# Altium schematic symbol library jlcpcb_2025_04_resistors_extended_2512.schlib: 2667 symbols (part 6 of 14) (continued)
## CRGP2512F100K
designator R?  Resistance: 100kΩ  (hidden comment: *)
Resistor, 100kΩ, ±1%, 2W, 500V, ±100ppm/℃, -55℃~+155℃, SMD 2512; Manufacturer: Uniroyal; Manufacturer Part Number: CRGP2512F100K; Supplier 1: LCSC; Supplier Part Number 1: C2073427; JLCPCB Part Number: C2073427; Power Rating: 2W; Category: Resistors; Package Size: 2512; JLCPCB Basic Part: Yes; Tolerance: ±1%; Voltage Rating: 500V; Temperature Coefficient: ±100ppm/℃; Temperature Rating: -55℃~+155℃; ComponentLink1Description: Datasheet; ComponentLink1URL: https://wmsc.lcsc.com/wmsc/upload/file/pdf/v2/lcsc/2304140030_TE-Connectivity-CRGP2512F100K_C2073427.pdf; ComponentLink2Description: JLCPCB Part URL; ComponentLink2URL: https://jlcpcb.com/partdetail/C2073427
pins: 1, 2
1 alternate drawing of the same symbol

## CRGP2512F220R
designator R?  Resistance: 220Ω  (hidden comment: *)
Resistor, 220Ω, ±1%, 2W, 500V, ±100ppm/℃, -55℃~+155℃, SMD 2512; Manufacturer: Uniroyal; Manufacturer Part Number: CRGP2512F220R; Supplier 1: LCSC; Supplier Part Number 1: C2075299; JLCPCB Part Number: C2075299; Power Rating: 2W; Category: Resistors; Package Size: 2512; JLCPCB Basic Part: Yes; Tolerance: ±1%; Voltage Rating: 500V; Temperature Coefficient: ±100ppm/℃; Temperature Rating: -55℃~+155℃; ComponentLink1Description: Datasheet; ComponentLink1URL: https://wmsc.lcsc.com/wmsc/upload/file/pdf/v2/lcsc/2304140030_TE-Connectivity-CRGP2512F220R_C2075299.pdf; ComponentLink2Description: JLCPCB Part URL; ComponentLink2URL: https://jlcpcb.com/partdetail/C2075299
pins: 1, 2
1 alternate drawing of the same symbol

## CRGP2512F820R
designator R?  Resistance: 820Ω  (hidden comment: *)
Resistor, 820Ω, ±1%, 2W, ±100ppm/℃, -55℃~+155℃, SMD 2512; Manufacturer: Uniroyal; Manufacturer Part Number: CRGP2512F820R; Supplier 1: LCSC; Supplier Part Number 1: C4287698; JLCPCB Part Number: C4287698; Power Rating: 2W; Category: Resistors; Package Size: 2512; JLCPCB Basic Part: Yes; Tolerance: ±1%; Temperature Coefficient: ±100ppm/℃; Temperature Rating: -55℃~+155℃; ComponentLink1Description: Datasheet; ComponentLink1URL: https://wmsc.lcsc.com/wmsc/upload/file/pdf/v2/lcsc/2403201310_TE-Connectivity-CRGP2512F820R_C4287698.pdf; ComponentLink2Description: JLCPCB Part URL; ComponentLink2URL: https://jlcpcb.com/partdetail/C4287698
pins: 1, 2
1 alternate drawing of the same symbol

## CRH2512F1K20E04Z
designator R?  Resistance: 1.2kΩ  (hidden comment: *)
Resistor, 1.2kΩ, ±1%, 2W, 200V, ±100ppm/℃, -55℃~+155℃, SMD 2512; Manufacturer: Uniroyal; Manufacturer Part Number: CRH2512F1K20E04Z; Supplier 1: LCSC; Supplier Part Number 1: C175323; JLCPCB Part Number: C175323; Power Rating: 2W; Category: Resistors; Package Size: 2512; JLCPCB Basic Part: Yes; Tolerance: ±1%; Voltage Rating: 200V; Temperature Coefficient: ±100ppm/℃; Temperature Rating: -55℃~+155℃; ComponentLink1Description: Datasheet; ComponentLink1URL: https://wmsc.lcsc.com/wmsc/upload/file/pdf/v2/lcsc/2304140030_Ever-Ohms-Tech-CRH2512F1K20E04Z_C175323.pdf; ComponentLink2Description: JLCPCB Part URL; ComponentLink2URL: https://jlcpcb.com/partdetail/C175323
pins: 1, 2
1 alternate drawing of the same symbol

## CRH2512F1K50E04Z
designator R?  Resistance: 1.5kΩ  (hidden comment: *)
Resistor, 1.5kΩ, ±1%, 2W, 200V, ±100ppm/℃, -55℃~+155℃, SMD 2512; Manufacturer: Uniroyal; Manufacturer Part Number: CRH2512F1K50E04Z; Supplier 1: LCSC; Supplier Part Number 1: C175325; JLCPCB Part Number: C175325; Power Rating: 2W; Category: Resistors; Package Size: 2512; JLCPCB Basic Part: Yes; Tolerance: ±1%; Voltage Rating: 200V; Temperature Coefficient: ±100ppm/℃; Temperature Rating: -55℃~+155℃; ComponentLink1Description: Datasheet; ComponentLink1URL: https://wmsc.lcsc.com/wmsc/upload/file/pdf/v2/lcsc/2304140030_Ever-Ohms-Tech-CRH2512F1K50E04Z_C175325.pdf; ComponentLink2Description: JLCPCB Part URL; ComponentLink2URL: https://jlcpcb.com/partdetail/C175325
pins: 1, 2
1 alternate drawing of the same symbol

## CRH2512F1R00E04S
designator R?  Resistance: 1Ω  (hidden comment: *)
Resistor, 1Ω, ±1%, 2W, 200V, ±400ppm/℃, -55℃~+155℃, SMD 2512; Manufacturer: Uniroyal; Manufacturer Part Number: CRH2512F1R00E04S; Supplier 1: LCSC; Supplier Part Number 1: C2832126; JLCPCB Part Number: C2832126; Power Rating: 2W; Category: Resistors; Package Size: 2512; JLCPCB Basic Part: Yes; Tolerance: ±1%; Voltage Rating: 200V; Temperature Coefficient: ±400ppm/℃; Temperature Rating: -55℃~+155℃; ComponentLink1Description: Datasheet; ComponentLink1URL: https://wmsc.lcsc.com/wmsc/upload/file/pdf/v2/lcsc/2105241455_Ever-Ohms-Tech-CRH2512F1R00E04S_C2832126.pdf; ComponentLink2Description: JLCPCB Part URL; ComponentLink2URL: https://jlcpcb.com/partdetail/C2832126
pins: 1, 2
1 alternate drawing of the same symbol

## CRH2512F1R20E04S
designator R?  Resistance: 1.2Ω  (hidden comment: *)
Resistor, 1.2Ω, ±1%, 2W, 200V, ±400ppm/℃, -55℃~+155℃, SMD 2512; Manufacturer: Uniroyal; Manufacturer Part Number: CRH2512F1R20E04S; Supplier 1: LCSC; Supplier Part Number 1: C2897628; JLCPCB Part Number: C2897628; Power Rating: 2W; Category: Resistors; Package Size: 2512; JLCPCB Basic Part: Yes; Tolerance: ±1%; Voltage Rating: 200V; Temperature Coefficient: ±400ppm/℃; Temperature Rating: -55℃~+155℃; ComponentLink1Description: Datasheet; ComponentLink1URL: https://wmsc.lcsc.com/wmsc/upload/file/pdf/v2/lcsc/2109152030_Ever-Ohms-Tech-CRH2512F1R20E04S_C2897628.pdf; ComponentLink2Description: JLCPCB Part URL; ComponentLink2URL: https://jlcpcb.com/partdetail/C2897628
pins: 1, 2
1 alternate drawing of the same symbol

## CRH2512F1R20E04Z
designator R?  Resistance: 1.2Ω  (hidden comment: *)
Resistor, 1.2Ω, ±1%, 2W, 200V, ±400ppm/℃, -55℃~+155℃, SMD 2512; Manufacturer: Uniroyal; Manufacturer Part Number: CRH2512F1R20E04Z; Supplier 1: LCSC; Supplier Part Number 1: C149854; JLCPCB Part Number: C149854; Power Rating: 2W; Category: Resistors; Package Size: 2512; JLCPCB Basic Part: Yes; Tolerance: ±1%; Voltage Rating: 200V; Temperature Coefficient: ±400ppm/℃; Temperature Rating: -55℃~+155℃; ComponentLink1Description: Datasheet; ComponentLink1URL: https://wmsc.lcsc.com/wmsc/upload/file/pdf/v2/lcsc/2304140030_Ever-Ohms-Tech-CRH2512F1R20E04Z_C149854.pdf; ComponentLink2Description: JLCPCB Part URL; ComponentLink2URL: https://jlcpcb.com/partdetail/C149854
pins: 1, 2
1 alternate drawing of the same symbol

## CRH2512F1R50E04S
designator R?  Resistance: 1.5Ω  (hidden comment: *)
Resistor, 1.5Ω, ±1%, 2W, 200V, ±400ppm/℃, -55℃~+155℃, SMD 2512; Manufacturer: Uniroyal; Manufacturer Part Number: CRH2512F1R50E04S; Supplier 1: LCSC; Supplier Part Number 1: C2928913; JLCPCB Part Number: C2928913; Power Rating: 2W; Category: Resistors; Package Size: 2512; JLCPCB Basic Part: Yes; Tolerance: ±1%; Voltage Rating: 200V; Temperature Coefficient: ±400ppm/℃; Temperature Rating: -55℃~+155℃; ComponentLink1Description: Datasheet; ComponentLink1URL: https://wmsc.lcsc.com/wmsc/upload/file/pdf/v2/lcsc/2201121400_Ever-Ohms-Tech-CRH2512F1R50E04S_C2928913.pdf; ComponentLink2Description: JLCPCB Part URL; ComponentLink2URL: https://jlcpcb.com/partdetail/C2928913
pins: 1, 2
1 alternate drawing of the same symbol

## CRH2512F1R80E04Z
designator R?  Resistance: 1.8Ω  (hidden comment: *)
Resistor, 1.8Ω, ±1%, 2W, 200V, ±400ppm/℃, -55℃~+155℃, SMD 2512; Manufacturer: Uniroyal; Manufacturer Part Number: CRH2512F1R80E04Z; Supplier 1: LCSC; Supplier Part Number 1: C175221; JLCPCB Part Number: C175221; Power Rating: 2W; Category: Resistors; Package Size: 2512; JLCPCB Basic Part: Yes; Tolerance: ±1%; Voltage Rating: 200V; Temperature Coefficient: ±400ppm/℃; Temperature Rating: -55℃~+155℃; ComponentLink1Description: Datasheet; ComponentLink1URL: https://wmsc.lcsc.com/wmsc/upload/file/pdf/v2/lcsc/2304140030_Ever-Ohms-Tech-CRH2512F1R80E04Z_C175221.pdf; ComponentLink2Description: JLCPCB Part URL; ComponentLink2URL: https://jlcpcb.com/partdetail/C175221
pins: 1, 2
1 alternate drawing of the same symbol

## CRH2512F2R20E04Z
designator R?  Resistance: 2.2Ω  (hidden comment: *)
Resistor, 2.2Ω, ±1%, 2W, 200V, ±400ppm/℃, -55℃~+155℃, SMD 2512; Manufacturer: Uniroyal; Manufacturer Part Number: CRH2512F2R20E04Z; Supplier 1: LCSC; Supplier Part Number 1: C175223; JLCPCB Part Number: C175223; Power Rating: 2W; Category: Resistors; Package Size: 2512; JLCPCB Basic Part: Yes; Tolerance: ±1%; Voltage Rating: 200V; Temperature Coefficient: ±400ppm/℃; Temperature Rating: -55℃~+155℃; ComponentLink1Description: Datasheet; ComponentLink1URL: https://wmsc.lcsc.com/wmsc/upload/file/pdf/v2/lcsc/2304140030_Ever-Ohms-Tech-CRH2512F2R20E04Z_C175223.pdf; ComponentLink2Description: JLCPCB Part URL; ComponentLink2URL: https://jlcpcb.com/partdetail/C175223
pins: 1, 2
1 alternate drawing of the same symbol

## CRH2512F3K00E04Z
designator R?  Resistance: 3kΩ  (hidden comment: *)
Resistor, 3kΩ, ±1%, 2W, 200V, ±100ppm/℃, -55℃~+155℃, SMD 2512; Manufacturer: Uniroyal; Manufacturer Part Number: CRH2512F3K00E04Z; Supplier 1: LCSC; Supplier Part Number 1: C175333; JLCPCB Part Number: C175333; Power Rating: 2W; Category: Resistors; Package Size: 2512; JLCPCB Basic Part: Yes; Tolerance: ±1%; Voltage Rating: 200V; Temperature Coefficient: ±100ppm/℃; Temperature Rating: -55℃~+155℃; ComponentLink1Description: Datasheet; ComponentLink1URL: https://wmsc.lcsc.com/wmsc/upload/file/pdf/v2/lcsc/2310271456_Ever-Ohms-Tech-CRH2512F3K00E04Z_C175333.pdf; ComponentLink2Description: JLCPCB Part URL; ComponentLink2URL: https://jlcpcb.com/partdetail/C175333
pins: 1, 2
1 alternate drawing of the same symbol

## CRH2512F3R90E04Z
designator R?  Resistance: 3.9Ω  (hidden comment: *)
Resistor, 3.9Ω, ±1%, 2W, 200V, ±400ppm/℃, -55℃~+155℃, SMD 2512; Manufacturer: Uniroyal; Manufacturer Part Number: CRH2512F3R90E04Z; Supplier 1: LCSC; Supplier Part Number 1: C175232; JLCPCB Part Number: C175232; Power Rating: 2W; Category: Resistors; Package Size: 2512; JLCPCB Basic Part: Yes; Tolerance: ±1%; Voltage Rating: 200V; Temperature Coefficient: ±400ppm/℃; Temperature Rating: -55℃~+155℃; ComponentLink1Description: Datasheet; ComponentLink1URL: https://wmsc.lcsc.com/wmsc/upload/file/pdf/v2/lcsc/2304140030_Ever-Ohms-Tech-CRH2512F3R90E04Z_C175232.pdf; ComponentLink2Description: JLCPCB Part URL; ComponentLink2URL: https://jlcpcb.com/partdetail/C175232
pins: 1, 2
1 alternate drawing of the same symbol

## CRH2512F4R70E04S
designator R?  Resistance: 4.7Ω  (hidden comment: *)
Resistor, 4.7Ω, ±1%, 2W, 200V, ±400ppm/℃, -55℃~+155℃, SMD 2512; Manufacturer: Uniroyal; Manufacturer Part Number: CRH2512F4R70E04S; Supplier 1: LCSC; Supplier Part Number 1: C2897629; JLCPCB Part Number: C2897629; Power Rating: 2W; Category: Resistors; Package Size: 2512; JLCPCB Basic Part: Yes; Tolerance: ±1%; Voltage Rating: 200V; Temperature Coefficient: ±400ppm/℃; Temperature Rating: -55℃~+155℃; ComponentLink1Description: Datasheet; ComponentLink1URL: https://wmsc.lcsc.com/wmsc/upload/file/pdf/v2/lcsc/2109152030_Ever-Ohms-Tech-CRH2512F4R70E04S_C2897629.pdf; ComponentLink2Description: JLCPCB Part URL; ComponentLink2URL: https://jlcpcb.com/partdetail/C2897629
pins: 1, 2
1 alternate drawing of the same symbol

## CRH2512F5K10E04Z
designator R?  Resistance: 5.1kΩ  (hidden comment: *)
Resistor, 5.1kΩ, ±1%, 2W, 200V, ±100ppm/℃, -55℃~+155℃, SMD 2512; Manufacturer: Uniroyal; Manufacturer Part Number: CRH2512F5K10E04Z; Supplier 1: LCSC; Supplier Part Number 1: C175339; JLCPCB Part Number: C175339; Power Rating: 2W; Category: Resistors; Package Size: 2512; JLCPCB Basic Part: Yes; Tolerance: ±1%; Voltage Rating: 200V; Temperature Coefficient: ±100ppm/℃; Temperature Rating: -55℃~+155℃; ComponentLink1Description: Datasheet; ComponentLink1URL: https://wmsc.lcsc.com/wmsc/upload/file/pdf/v2/lcsc/2304140030_Ever-Ohms-Tech-CRH2512F5K10E04Z_C175339.pdf; ComponentLink2Description: JLCPCB Part URL; ComponentLink2URL: https://jlcpcb.com/partdetail/C175339
pins: 1, 2
1 alternate drawing of the same symbol

## CRH2512F5R10E04Z
designator R?  Resistance: 5.1Ω  (hidden comment: *)
Resistor, 5.1Ω, ±1%, 2W, 200V, ±400ppm/℃, -55℃~+155℃, SMD 2512; Manufacturer: Uniroyal; Manufacturer Part Number: CRH2512F5R10E04Z; Supplier 1: LCSC; Supplier Part Number 1: C175234; JLCPCB Part Number: C175234; Power Rating: 2W; Category: Resistors; Package Size: 2512; JLCPCB Basic Part: Yes; Tolerance: ±1%; Voltage Rating: 200V; Temperature Coefficient: ±400ppm/℃; Temperature Rating: -55℃~+155℃; ComponentLink1Description: Datasheet; ComponentLink1URL: https://wmsc.lcsc.com/wmsc/upload/file/pdf/v2/lcsc/2304140030_Ever-Ohms-Tech-CRH2512F5R10E04Z_C175234.pdf; ComponentLink2Description: JLCPCB Part URL; ComponentLink2URL: https://jlcpcb.com/partdetail/C175234
pins: 1, 2
1 alternate drawing of the same symbol

## CRH2512F6R80E04Z
designator R?  Resistance: 6.8Ω  (hidden comment: *)
Resistor, 6.8Ω, ±1%, 2W, 200V, ±400ppm/℃, -55℃~+155℃, SMD 2512; Manufacturer: Uniroyal; Manufacturer Part Number: CRH2512F6R80E04Z; Supplier 1: LCSC; Supplier Part Number 1: C175235; JLCPCB Part Number: C175235; Power Rating: 2W; Category: Resistors; Package Size: 2512; JLCPCB Basic Part: Yes; Tolerance: ±1%; Voltage Rating: 200V; Temperature Coefficient: ±400ppm/℃; Temperature Rating: -55℃~+155℃; ComponentLink1Description: Datasheet; ComponentLink1URL: https://wmsc.lcsc.com/wmsc/upload/file/pdf/v2/lcsc/2304140030_Ever-Ohms-Tech-CRH2512F6R80E04Z_C175235.pdf; ComponentLink2Description: JLCPCB Part URL; ComponentLink2URL: https://jlcpcb.com/partdetail/C175235
pins: 1, 2
1 alternate drawing of the same symbol

## CRH2512F10K0E04Z
designator R?  Resistance: 10kΩ  (hidden comment: *)
Resistor, 10kΩ, ±1%, 2W, 200V, ±100ppm/℃, -55℃~+155℃, SMD 2512; Manufacturer: Uniroyal; Manufacturer Part Number: CRH2512F10K0E04Z; Supplier 1: LCSC; Supplier Part Number 1: C175347; JLCPCB Part Number: C175347; Power Rating: 2W; Category: Resistors; Package Size: 2512; JLCPCB Basic Part: Yes; Tolerance: ±1%; Voltage Rating: 200V; Temperature Coefficient: ±100ppm/℃; Temperature Rating: -55℃~+155℃; ComponentLink1Description: Datasheet; ComponentLink1URL: https://wmsc.lcsc.com/wmsc/upload/file/pdf/v2/lcsc/2304140030_Ever-Ohms-Tech-CRH2512F10K0E04Z_C175347.pdf; ComponentLink2Description: JLCPCB Part URL; ComponentLink2URL: https://jlcpcb.com/partdetail/C175347
pins: 1, 2
1 alternate drawing of the same symbol

## CRH2512F12R0E04Z
designator R?  Resistance: 12Ω  (hidden comment: *)
Resistor, 12Ω, ±1%, 2W, 200V, ±100ppm/℃, -55℃~+155℃, SMD 2512; Manufacturer: Uniroyal; Manufacturer Part Number: CRH2512F12R0E04Z; Supplier 1: LCSC; Supplier Part Number 1: C175241; JLCPCB Part Number: C175241; Power Rating: 2W; Category: Resistors; Package Size: 2512; JLCPCB Basic Part: Yes; Tolerance: ±1%; Voltage Rating: 200V; Temperature Coefficient: ±100ppm/℃; Temperature Rating: -55℃~+155℃; ComponentLink1Description: Datasheet; ComponentLink1URL: https://wmsc.lcsc.com/wmsc/upload/file/pdf/v2/lcsc/2304140030_Ever-Ohms-Tech-CRH2512F12R0E04Z_C175241.pdf; ComponentLink2Description: JLCPCB Part URL; ComponentLink2URL: https://jlcpcb.com/partdetail/C175241
pins: 1, 2
1 alternate drawing of the same symbol

## CRH2512F15K0E04Z
designator R?  Resistance: 15kΩ  (hidden comment: *)
Resistor, 15kΩ, ±1%, 2W, 200V, ±100ppm/℃, -55℃~+155℃, SMD 2512; Manufacturer: Uniroyal; Manufacturer Part Number: CRH2512F15K0E04Z; Supplier 1: LCSC; Supplier Part Number 1: C175349; JLCPCB Part Number: C175349; Power Rating: 2W; Category: Resistors; Package Size: 2512; JLCPCB Basic Part: Yes; Tolerance: ±1%; Voltage Rating: 200V; Temperature Coefficient: ±100ppm/℃; Temperature Rating: -55℃~+155℃; ComponentLink1Description: Datasheet; ComponentLink1URL: https://wmsc.lcsc.com/wmsc/upload/file/pdf/v2/lcsc/2304140030_Ever-Ohms-Tech-CRH2512F15K0E04Z_C175349.pdf; ComponentLink2Description: JLCPCB Part URL; ComponentLink2URL: https://jlcpcb.com/partdetail/C175349
pins: 1, 2
1 alternate drawing of the same symbol

## CRH2512F16R0E04Z
designator R?  Resistance: 16Ω  (hidden comment: *)
Resistor, 16Ω, ±1%, 2W, 200V, ±100ppm/℃, -55℃~+155℃, SMD 2512; Manufacturer: Uniroyal; Manufacturer Part Number: CRH2512F16R0E04Z; Supplier 1: LCSC; Supplier Part Number 1: C175246; JLCPCB Part Number: C175246; Power Rating: 2W; Category: Resistors; Package Size: 2512; JLCPCB Basic Part: Yes; Tolerance: ±1%; Voltage Rating: 200V; Temperature Coefficient: ±100ppm/℃; Temperature Rating: -55℃~+155℃; ComponentLink1Description: Datasheet; ComponentLink1URL: https://wmsc.lcsc.com/wmsc/upload/file/pdf/v2/lcsc/2304140030_Ever-Ohms-Tech-CRH2512F16R0E04Z_C175246.pdf; ComponentLink2Description: JLCPCB Part URL; ComponentLink2URL: https://jlcpcb.com/partdetail/C175246
pins: 1, 2
1 alternate drawing of the same symbol

## CRH2512F18R0E04Z
designator R?  Resistance: 18Ω  (hidden comment: *)
Resistor, 18Ω, ±1%, 2W, 200V, ±100ppm/℃, -55℃~+155℃, SMD 2512; Manufacturer: Uniroyal; Manufacturer Part Number: CRH2512F18R0E04Z; Supplier 1: LCSC; Supplier Part Number 1: C175248; JLCPCB Part Number: C175248; Power Rating: 2W; Category: Resistors; Package Size: 2512; JLCPCB Basic Part: Yes; Tolerance: ±1%; Voltage Rating: 200V; Temperature Coefficient: ±100ppm/℃; Temperature Rating: -55℃~+155℃; ComponentLink1Description: Datasheet; ComponentLink1URL: https://wmsc.lcsc.com/wmsc/upload/file/pdf/v2/lcsc/2304140030_Ever-Ohms-Tech-CRH2512F18R0E04Z_C175248.pdf; ComponentLink2Description: JLCPCB Part URL; ComponentLink2URL: https://jlcpcb.com/partdetail/C175248
pins: 1, 2
1 alternate drawing of the same symbol

## CRH2512F22K0E04Z
designator R?  Resistance: 22kΩ  (hidden comment: *)
Resistor, 22kΩ, ±1%, 2W, 200V, ±100ppm/℃, -55℃~+155℃, SMD 2512; Manufacturer: Uniroyal; Manufacturer Part Number: CRH2512F22K0E04Z; Supplier 1: LCSC; Supplier Part Number 1: C175352; JLCPCB Part Number: C175352; Power Rating: 2W; Category: Resistors; Package Size: 2512; JLCPCB Basic Part: Yes; Tolerance: ±1%; Voltage Rating: 200V; Temperature Coefficient: ±100ppm/℃; Temperature Rating: -55℃~+155℃; ComponentLink1Description: Datasheet; ComponentLink1URL: https://wmsc.lcsc.com/wmsc/upload/file/pdf/v2/lcsc/2304140030_Ever-Ohms-Tech-CRH2512F22K0E04Z_C175352.pdf; ComponentLink2Description: JLCPCB Part URL; ComponentLink2URL: https://jlcpcb.com/partdetail/C175352
pins: 1, 2
1 alternate drawing of the same symbol

## CRH2512F22R0E04Z
designator R?  Resistance: 22Ω  (hidden comment: *)
Resistor, 22Ω, ±1%, 2W, 200V, ±100ppm/℃, -55℃~+155℃, SMD 2512; Manufacturer: Uniroyal; Manufacturer Part Number: CRH2512F22R0E04Z; Supplier 1: LCSC; Supplier Part Number 1: C175252; JLCPCB Part Number: C175252; Power Rating: 2W; Category: Resistors; Package Size: 2512; JLCPCB Basic Part: Yes; Tolerance: ±1%; Voltage Rating: 200V; Temperature Coefficient: ±100ppm/℃; Temperature Rating: -55℃~+155℃; ComponentLink1Description: Datasheet; ComponentLink1URL: https://wmsc.lcsc.com/wmsc/upload/file/pdf/v2/lcsc/2304140030_Ever-Ohms-Tech-CRH2512F22R0E04Z_C175252.pdf; ComponentLink2Description: JLCPCB Part URL; ComponentLink2URL: https://jlcpcb.com/partdetail/C175252
pins: 1, 2
1 alternate drawing of the same symbol

## CRH2512F24K3E04Z
designator R?  Resistance: 24.3kΩ  (hidden comment: *)
Resistor, 24.3kΩ, ±1%, 2W, 200V, ±100ppm/℃, -55℃~+155℃, SMD 2512; Manufacturer: Uniroyal; Manufacturer Part Number: CRH2512F24K3E04Z; Supplier 1: LCSC; Supplier Part Number 1: C149856; JLCPCB Part Number: C149856; Power Rating: 2W; Category: Resistors; Package Size: 2512; JLCPCB Basic Part: Yes; Tolerance: ±1%; Voltage Rating: 200V; Temperature Coefficient: ±100ppm/℃; Temperature Rating: -55℃~+155℃; ComponentLink1Description: Datasheet; ComponentLink1URL: https://wmsc.lcsc.com/wmsc/upload/file/pdf/v2/lcsc/2304140030_Ever-Ohms-Tech-CRH2512F24K3E04Z_C149856.pdf; ComponentLink2Description: JLCPCB Part URL; ComponentLink2URL: https://jlcpcb.com/partdetail/C149856
pins: 1, 2
1 alternate drawing of the same symbol

## CRH2512F24R0E04Z
designator R?  Resistance: 24Ω  (hidden comment: *)
Resistor, 24Ω, ±1%, 2W, 200V, ±100ppm/℃, -55℃~+155℃, SMD 2512; Manufacturer: Uniroyal; Manufacturer Part Number: CRH2512F24R0E04Z; Supplier 1: LCSC; Supplier Part Number 1: C175254; JLCPCB Part Number: C175254; Power Rating: 2W; Category: Resistors; Package Size: 2512; JLCPCB Basic Part: Yes; Tolerance: ±1%; Voltage Rating: 200V; Temperature Coefficient: ±100ppm/℃; Temperature Rating: -55℃~+155℃; ComponentLink1Description: Datasheet; ComponentLink1URL: https://wmsc.lcsc.com/wmsc/upload/file/pdf/v2/lcsc/2304140030_Ever-Ohms-Tech-CRH2512F24R0E04Z_C175254.pdf; ComponentLink2Description: JLCPCB Part URL; ComponentLink2URL: https://jlcpcb.com/partdetail/C175254
pins: 1, 2
1 alternate drawing of the same symbol

## CRH2512F27K0E04Z
designator R?  Resistance: 27kΩ  (hidden comment: *)
Resistor, 27kΩ, ±1%, 2W, 200V, ±100ppm/℃, -55℃~+155℃, SMD 2512; Manufacturer: Uniroyal; Manufacturer Part Number: CRH2512F27K0E04Z; Supplier 1: LCSC; Supplier Part Number 1: C175358; JLCPCB Part Number: C175358; Power Rating: 2W; Category: Resistors; Package Size: 2512; JLCPCB Basic Part: Yes; Tolerance: ±1%; Voltage Rating: 200V; Temperature Coefficient: ±100ppm/℃; Temperature Rating: -55℃~+155℃; ComponentLink1Description: Datasheet; ComponentLink1URL: https://wmsc.lcsc.com/wmsc/upload/file/pdf/v2/lcsc/2304140030_Ever-Ohms-Tech-CRH2512F27K0E04Z_C175358.pdf; ComponentLink2Description: JLCPCB Part URL; ComponentLink2URL: https://jlcpcb.com/partdetail/C175358
pins: 1, 2
1 alternate drawing of the same symbol

## CRH2512F33R0E04Z
designator R?  Resistance: 33Ω  (hidden comment: *)
Resistor, 33Ω, ±1%, 2W, 200V, ±100ppm/℃, -55℃~+155℃, SMD 2512; Manufacturer: Uniroyal; Manufacturer Part Number: CRH2512F33R0E04Z; Supplier 1: LCSC; Supplier Part Number 1: C175260; JLCPCB Part Number: C175260; Power Rating: 2W; Category: Resistors; Package Size: 2512; JLCPCB Basic Part: Yes; Tolerance: ±1%; Voltage Rating: 200V; Temperature Coefficient: ±100ppm/℃; Temperature Rating: -55℃~+155℃; ComponentLink1Description: Datasheet; ComponentLink1URL: https://wmsc.lcsc.com/wmsc/upload/file/pdf/v2/lcsc/2304140030_Ever-Ohms-Tech-CRH2512F33R0E04Z_C175260.pdf; ComponentLink2Description: JLCPCB Part URL; ComponentLink2URL: https://jlcpcb.com/partdetail/C175260
pins: 1, 2
1 alternate drawing of the same symbol

## CRH2512F39R0E04Z
designator R?  Resistance: 39Ω  (hidden comment: *)
Resistor, 39Ω, ±1%, 2W, 200V, ±100ppm/℃, -55℃~+155℃, SMD 2512; Manufacturer: Uniroyal; Manufacturer Part Number: CRH2512F39R0E04Z; Supplier 1: LCSC; Supplier Part Number 1: C175263; JLCPCB Part Number: C175263; Power Rating: 2W; Category: Resistors; Package Size: 2512; JLCPCB Basic Part: Yes; Tolerance: ±1%; Voltage Rating: 200V; Temperature Coefficient: ±100ppm/℃; Temperature Rating: -55℃~+155℃; ComponentLink1Description: Datasheet; ComponentLink1URL: https://wmsc.lcsc.com/wmsc/upload/file/pdf/v2/lcsc/2304140030_Ever-Ohms-Tech-CRH2512F39R0E04Z_C175263.pdf; ComponentLink2Description: JLCPCB Part URL; ComponentLink2URL: https://jlcpcb.com/partdetail/C175263
pins: 1, 2
1 alternate drawing of the same symbol

## CRH2512F43K0E04Z
designator R?  Resistance: 43kΩ  (hidden comment: *)
Resistor, 43kΩ, ±1%, 2W, 200V, ±100ppm/℃, -55℃~+155℃, SMD 2512; Manufacturer: Uniroyal; Manufacturer Part Number: CRH2512F43K0E04Z; Supplier 1: LCSC; Supplier Part Number 1: C175362; JLCPCB Part Number: C175362; Power Rating: 2W; Category: Resistors; Package Size: 2512; JLCPCB Basic Part: Yes; Tolerance: ±1%; Voltage Rating: 200V; Temperature Coefficient: ±100ppm/℃; Temperature Rating: -55℃~+155℃; ComponentLink1Description: Datasheet; ComponentLink1URL: https://wmsc.lcsc.com/wmsc/upload/file/pdf/v2/lcsc/2304140030_Ever-Ohms-Tech-CRH2512F43K0E04Z_C175362.pdf; ComponentLink2Description: JLCPCB Part URL; ComponentLink2URL: https://jlcpcb.com/partdetail/C175362
pins: 1, 2
1 alternate drawing of the same symbol

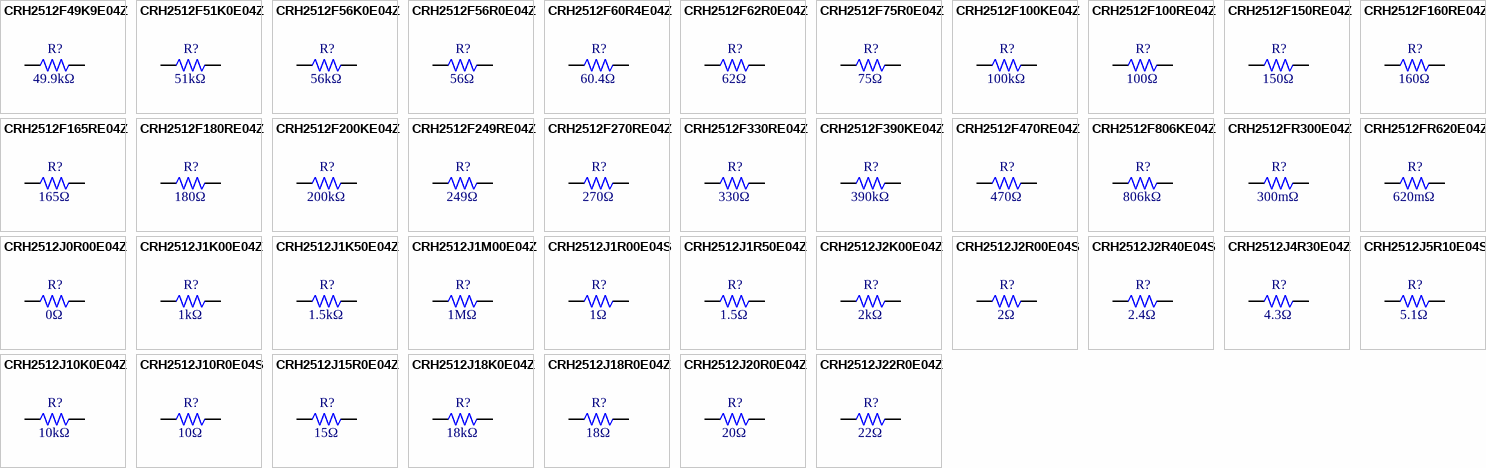
[diagram p29: symbols CRH2512F49K9E04Z to CRH2512J22R0E04Z]

## CRH2512F49K9E04Z
designator R?  Resistance: 49.9kΩ  (hidden comment: *)
Resistor, 49.9kΩ, ±1%, 2W, 200V, ±100ppm/℃, -55℃~+155℃, SMD 2512; Manufacturer: Uniroyal; Manufacturer Part Number: CRH2512F49K9E04Z; Supplier 1: LCSC; Supplier Part Number 1: C175366; JLCPCB Part Number: C175366; Power Rating: 2W; Category: Resistors; Package Size: 2512; JLCPCB Basic Part: Yes; Tolerance: ±1%; Voltage Rating: 200V; Temperature Coefficient: ±100ppm/℃; Temperature Rating: -55℃~+155℃; ComponentLink1Description: Datasheet; ComponentLink1URL: https://wmsc.lcsc.com/wmsc/upload/file/pdf/v2/lcsc/2304140030_Ever-Ohms-Tech-CRH2512F49K9E04Z_C175366.pdf; ComponentLink2Description: JLCPCB Part URL; ComponentLink2URL: https://jlcpcb.com/partdetail/C175366
pins: 1, 2
1 alternate drawing of the same symbol

## CRH2512F51K0E04Z
designator R?  Resistance: 51kΩ  (hidden comment: *)
Resistor, 51kΩ, ±1%, 2W, 200V, ±100ppm/℃, -55℃~+155℃, SMD 2512; Manufacturer: Uniroyal; Manufacturer Part Number: CRH2512F51K0E04Z; Supplier 1: LCSC; Supplier Part Number 1: C175367; JLCPCB Part Number: C175367; Power Rating: 2W; Category: Resistors; Package Size: 2512; JLCPCB Basic Part: Yes; Tolerance: ±1%; Voltage Rating: 200V; Temperature Coefficient: ±100ppm/℃; Temperature Rating: -55℃~+155℃; ComponentLink1Description: Datasheet; ComponentLink1URL: https://wmsc.lcsc.com/wmsc/upload/file/pdf/v2/lcsc/2304140030_Ever-Ohms-Tech-CRH2512F51K0E04Z_C175367.pdf; ComponentLink2Description: JLCPCB Part URL; ComponentLink2URL: https://jlcpcb.com/partdetail/C175367
pins: 1, 2
1 alternate drawing of the same symbol

## CRH2512F56K0E04Z
designator R?  Resistance: 56kΩ  (hidden comment: *)
Resistor, 56kΩ, ±1%, 2W, 200V, ±100ppm/℃, -55℃~+155℃, SMD 2512; Manufacturer: Uniroyal; Manufacturer Part Number: CRH2512F56K0E04Z; Supplier 1: LCSC; Supplier Part Number 1: C149857; JLCPCB Part Number: C149857; Power Rating: 2W; Category: Resistors; Package Size: 2512; JLCPCB Basic Part: Yes; Tolerance: ±1%; Voltage Rating: 200V; Temperature Coefficient: ±100ppm/℃; Temperature Rating: -55℃~+155℃; ComponentLink1Description: Datasheet; ComponentLink1URL: https://wmsc.lcsc.com/wmsc/upload/file/pdf/v2/lcsc/2304140030_Ever-Ohms-Tech-CRH2512F56K0E04Z_C149857.pdf; ComponentLink2Description: JLCPCB Part URL; ComponentLink2URL: https://jlcpcb.com/partdetail/C149857
pins: 1, 2
1 alternate drawing of the same symbol

## CRH2512F56R0E04Z
designator R?  Resistance: 56Ω  (hidden comment: *)
Resistor, 56Ω, ±1%, 2W, 200V, ±100ppm/℃, -55℃~+155℃, SMD 2512; Manufacturer: Uniroyal; Manufacturer Part Number: CRH2512F56R0E04Z; Supplier 1: LCSC; Supplier Part Number 1: C175269; JLCPCB Part Number: C175269; Power Rating: 2W; Category: Resistors; Package Size: 2512; JLCPCB Basic Part: Yes; Tolerance: ±1%; Voltage Rating: 200V; Temperature Coefficient: ±100ppm/℃; Temperature Rating: -55℃~+155℃; ComponentLink1Description: Datasheet; ComponentLink1URL: https://wmsc.lcsc.com/wmsc/upload/file/pdf/v2/lcsc/2304140030_Ever-Ohms-Tech-CRH2512F56R0E04Z_C175269.pdf; ComponentLink2Description: JLCPCB Part URL; ComponentLink2URL: https://jlcpcb.com/partdetail/C175269
pins: 1, 2
1 alternate drawing of the same symbol

## CRH2512F60R4E04Z
designator R?  Resistance: 60.4Ω  (hidden comment: *)
Resistor, 60.4Ω, ±1%, 2W, 200V, ±100ppm/℃, -55℃~+155℃, SMD 2512; Manufacturer: Uniroyal; Manufacturer Part Number: CRH2512F60R4E04Z; Supplier 1: LCSC; Supplier Part Number 1: C176065; JLCPCB Part Number: C176065; Power Rating: 2W; Category: Resistors; Package Size: 2512; JLCPCB Basic Part: Yes; Tolerance: ±1%; Voltage Rating: 200V; Temperature Coefficient: ±100ppm/℃; Temperature Rating: -55℃~+155℃; ComponentLink1Description: Datasheet; ComponentLink1URL: https://wmsc.lcsc.com/wmsc/upload/file/pdf/v2/lcsc/2304140030_Ever-Ohms-Tech-CRH2512F60R4E04Z_C176065.pdf; ComponentLink2Description: JLCPCB Part URL; ComponentLink2URL: https://jlcpcb.com/partdetail/C176065
pins: 1, 2
1 alternate drawing of the same symbol

## CRH2512F62R0E04Z
designator R?  Resistance: 62Ω  (hidden comment: *)
Resistor, 62Ω, ±1%, 2W, 200V, ±100ppm/℃, -55℃~+155℃, SMD 2512; Manufacturer: Uniroyal; Manufacturer Part Number: CRH2512F62R0E04Z; Supplier 1: LCSC; Supplier Part Number 1: C175273; JLCPCB Part Number: C175273; Power Rating: 2W; Category: Resistors; Package Size: 2512; JLCPCB Basic Part: Yes; Tolerance: ±1%; Voltage Rating: 200V; Temperature Coefficient: ±100ppm/℃; Temperature Rating: -55℃~+155℃; ComponentLink1Description: Datasheet; ComponentLink1URL: https://wmsc.lcsc.com/wmsc/upload/file/pdf/v2/lcsc/2304140030_Ever-Ohms-Tech-CRH2512F62R0E04Z_C175273.pdf; ComponentLink2Description: JLCPCB Part URL; ComponentLink2URL: https://jlcpcb.com/partdetail/C175273
pins: 1, 2
1 alternate drawing of the same symbol

## CRH2512F75R0E04Z
designator R?  Resistance: 75Ω  (hidden comment: *)
Resistor, 75Ω, ±1%, 2W, 200V, ±100ppm/℃, -55℃~+155℃, SMD 2512; Manufacturer: Uniroyal; Manufacturer Part Number: CRH2512F75R0E04Z; Supplier 1: LCSC; Supplier Part Number 1: C175275; JLCPCB Part Number: C175275; Power Rating: 2W; Category: Resistors; Package Size: 2512; JLCPCB Basic Part: Yes; Tolerance: ±1%; Voltage Rating: 200V; Temperature Coefficient: ±100ppm/℃; Temperature Rating: -55℃~+155℃; ComponentLink1Description: Datasheet; ComponentLink1URL: https://wmsc.lcsc.com/wmsc/upload/file/pdf/v2/lcsc/2304140030_Ever-Ohms-Tech-CRH2512F75R0E04Z_C175275.pdf; ComponentLink2Description: JLCPCB Part URL; ComponentLink2URL: https://jlcpcb.com/partdetail/C175275
pins: 1, 2
1 alternate drawing of the same symbol

## CRH2512F100KE04Z
designator R?  Resistance: 100kΩ  (hidden comment: *)
Resistor, 100kΩ, ±1%, 2W, 200V, ±100ppm/℃, -55℃~+155℃, SMD 2512; Manufacturer: Uniroyal; Manufacturer Part Number: CRH2512F100KE04Z; Supplier 1: LCSC; Supplier Part Number 1: C175374; JLCPCB Part Number: C175374; Power Rating: 2W; Category: Resistors; Package Size: 2512; JLCPCB Basic Part: Yes; Tolerance: ±1%; Voltage Rating: 200V; Temperature Coefficient: ±100ppm/℃; Temperature Rating: -55℃~+155℃; ComponentLink1Description: Datasheet; ComponentLink1URL: https://wmsc.lcsc.com/wmsc/upload/file/pdf/v2/lcsc/2304140030_Ever-Ohms-Tech-CRH2512F100KE04Z_C175374.pdf; ComponentLink2Description: JLCPCB Part URL; ComponentLink2URL: https://jlcpcb.com/partdetail/C175374
pins: 1, 2
1 alternate drawing of the same symbol

## CRH2512F100RE04Z
designator R?  Resistance: 100Ω  (hidden comment: *)
Resistor, 100Ω, ±1%, 2W, 200V, ±100ppm/℃, -55℃~+155℃, SMD 2512; Manufacturer: Uniroyal; Manufacturer Part Number: CRH2512F100RE04Z; Supplier 1: LCSC; Supplier Part Number 1: C175280; JLCPCB Part Number: C175280; Power Rating: 2W; Category: Resistors; Package Size: 2512; JLCPCB Basic Part: Yes; Tolerance: ±1%; Voltage Rating: 200V; Temperature Coefficient: ±100ppm/℃; Temperature Rating: -55℃~+155℃; ComponentLink1Description: Datasheet; ComponentLink1URL: https://wmsc.lcsc.com/wmsc/upload/file/pdf/v2/lcsc/2304140030_Ever-Ohms-Tech-CRH2512F100RE04Z_C175280.pdf; ComponentLink2Description: JLCPCB Part URL; ComponentLink2URL: https://jlcpcb.com/partdetail/C175280
pins: 1, 2
1 alternate drawing of the same symbol

## CRH2512F150RE04Z
designator R?  Resistance: 150Ω  (hidden comment: *)
Resistor, 150Ω, ±1%, 2W, 200V, ±100ppm/℃, -55℃~+155℃, SMD 2512; Manufacturer: Uniroyal; Manufacturer Part Number: CRH2512F150RE04Z; Supplier 1: LCSC; Supplier Part Number 1: C175287; JLCPCB Part Number: C175287; Power Rating: 2W; Category: Resistors; Package Size: 2512; JLCPCB Basic Part: Yes; Tolerance: ±1%; Voltage Rating: 200V; Temperature Coefficient: ±100ppm/℃; Temperature Rating: -55℃~+155℃; ComponentLink1Description: Datasheet; ComponentLink1URL: https://wmsc.lcsc.com/wmsc/upload/file/pdf/v2/lcsc/2304140030_Ever-Ohms-Tech-CRH2512F150RE04Z_C175287.pdf; ComponentLink2Description: JLCPCB Part URL; ComponentLink2URL: https://jlcpcb.com/partdetail/C175287
pins: 1, 2
1 alternate drawing of the same symbol

## CRH2512F160RE04Z
designator R?  Resistance: 160Ω  (hidden comment: *)
Resistor, 160Ω, ±1%, 2W, 200V, ±100ppm/℃, -55℃~+155℃, SMD 2512; Manufacturer: Uniroyal; Manufacturer Part Number: CRH2512F160RE04Z; Supplier 1: LCSC; Supplier Part Number 1: C175288; JLCPCB Part Number: C175288; Power Rating: 2W; Category: Resistors; Package Size: 2512; JLCPCB Basic Part: Yes; Tolerance: ±1%; Voltage Rating: 200V; Temperature Coefficient: ±100ppm/℃; Temperature Rating: -55℃~+155℃; ComponentLink1Description: Datasheet; ComponentLink1URL: https://wmsc.lcsc.com/wmsc/upload/file/pdf/v2/lcsc/2304140030_Ever-Ohms-Tech-CRH2512F160RE04Z_C175288.pdf; ComponentLink2Description: JLCPCB Part URL; ComponentLink2URL: https://jlcpcb.com/partdetail/C175288
pins: 1, 2
1 alternate drawing of the same symbol

## CRH2512F165RE04Z
designator R?  Resistance: 165Ω  (hidden comment: *)
Resistor, 165Ω, ±1%, 2W, 200V, ±100ppm/℃, -55℃~+155℃, SMD 2512; Manufacturer: Uniroyal; Manufacturer Part Number: CRH2512F165RE04Z; Supplier 1: LCSC; Supplier Part Number 1: C175290; JLCPCB Part Number: C175290; Power Rating: 2W; Category: Resistors; Package Size: 2512; JLCPCB Basic Part: Yes; Tolerance: ±1%; Voltage Rating: 200V; Temperature Coefficient: ±100ppm/℃; Temperature Rating: -55℃~+155℃; ComponentLink1Description: Datasheet; ComponentLink1URL: https://wmsc.lcsc.com/wmsc/upload/file/pdf/v2/lcsc/2304140030_Ever-Ohms-Tech-CRH2512F165RE04Z_C175290.pdf; ComponentLink2Description: JLCPCB Part URL; ComponentLink2URL: https://jlcpcb.com/partdetail/C175290
pins: 1, 2
1 alternate drawing of the same symbol

## CRH2512F180RE04Z
designator R?  Resistance: 180Ω  (hidden comment: *)
Resistor, 180Ω, ±1%, 2W, 200V, ±100ppm/℃, -55℃~+155℃, SMD 2512; Manufacturer: Uniroyal; Manufacturer Part Number: CRH2512F180RE04Z; Supplier 1: LCSC; Supplier Part Number 1: C175292; JLCPCB Part Number: C175292; Power Rating: 2W; Category: Resistors; Package Size: 2512; JLCPCB Basic Part: Yes; Tolerance: ±1%; Voltage Rating: 200V; Temperature Coefficient: ±100ppm/℃; Temperature Rating: -55℃~+155℃; ComponentLink1Description: Datasheet; ComponentLink1URL: https://wmsc.lcsc.com/wmsc/upload/file/pdf/v2/lcsc/2304140030_Ever-Ohms-Tech-CRH2512F180RE04Z_C175292.pdf; ComponentLink2Description: JLCPCB Part URL; ComponentLink2URL: https://jlcpcb.com/partdetail/C175292
pins: 1, 2
1 alternate drawing of the same symbol

## CRH2512F200KE04Z
designator R?  Resistance: 200kΩ  (hidden comment: *)
Resistor, 200kΩ, ±1%, 2W, 200V, ±100ppm/℃, -55℃~+155℃, SMD 2512; Manufacturer: Uniroyal; Manufacturer Part Number: CRH2512F200KE04Z; Supplier 1: LCSC; Supplier Part Number 1: C175379; JLCPCB Part Number: C175379; Power Rating: 2W; Category: Resistors; Package Size: 2512; JLCPCB Basic Part: Yes; Tolerance: ±1%; Voltage Rating: 200V; Temperature Coefficient: ±100ppm/℃; Temperature Rating: -55℃~+155℃; ComponentLink1Description: Datasheet; ComponentLink1URL: https://wmsc.lcsc.com/wmsc/upload/file/pdf/v2/lcsc/2304140030_Ever-Ohms-Tech-CRH2512F200KE04Z_C175379.pdf; ComponentLink2Description: JLCPCB Part URL; ComponentLink2URL: https://jlcpcb.com/partdetail/C175379
pins: 1, 2
1 alternate drawing of the same symbol

## CRH2512F249RE04Z
designator R?  Resistance: 249Ω  (hidden comment: *)
Resistor, 249Ω, ±1%, 2W, 200V, ±100ppm/℃, -55℃~+155℃, SMD 2512; Manufacturer: Uniroyal; Manufacturer Part Number: CRH2512F249RE04Z; Supplier 1: LCSC; Supplier Part Number 1: C175296; JLCPCB Part Number: C175296; Power Rating: 2W; Category: Resistors; Package Size: 2512; JLCPCB Basic Part: Yes; Tolerance: ±1%; Voltage Rating: 200V; Temperature Coefficient: ±100ppm/℃; Temperature Rating: -55℃~+155℃; ComponentLink1Description: Datasheet; ComponentLink1URL: https://wmsc.lcsc.com/wmsc/upload/file/pdf/v2/lcsc/2304140030_Ever-Ohms-Tech-CRH2512F249RE04Z_C175296.pdf; ComponentLink2Description: JLCPCB Part URL; ComponentLink2URL: https://jlcpcb.com/partdetail/C175296
pins: 1, 2
1 alternate drawing of the same symbol

## CRH2512F270RE04Z
designator R?  Resistance: 270Ω  (hidden comment: *)
Resistor, 270Ω, ±1%, 2W, 200V, ±100ppm/℃, -55℃~+155℃, SMD 2512; Manufacturer: Uniroyal; Manufacturer Part Number: CRH2512F270RE04Z; Supplier 1: LCSC; Supplier Part Number 1: C175301; JLCPCB Part Number: C175301; Power Rating: 2W; Category: Resistors; Package Size: 2512; JLCPCB Basic Part: Yes; Tolerance: ±1%; Voltage Rating: 200V; Temperature Coefficient: ±100ppm/℃; Temperature Rating: -55℃~+155℃; ComponentLink1Description: Datasheet; ComponentLink1URL: https://wmsc.lcsc.com/wmsc/upload/file/pdf/v2/lcsc/2304140030_Ever-Ohms-Tech-CRH2512F270RE04Z_C175301.pdf; ComponentLink2Description: JLCPCB Part URL; ComponentLink2URL: https://jlcpcb.com/partdetail/C175301
pins: 1, 2
1 alternate drawing of the same symbol

## CRH2512F330RE04Z
designator R?  Resistance: 330Ω  (hidden comment: *)
Resistor, 330Ω, ±1%, 2W, 200V, ±100ppm/℃, -55℃~+155℃, SMD 2512; Manufacturer: Uniroyal; Manufacturer Part Number: CRH2512F330RE04Z; Supplier 1: LCSC; Supplier Part Number 1: C175302; JLCPCB Part Number: C175302; Power Rating: 2W; Category: Resistors; Package Size: 2512; JLCPCB Basic Part: Yes; Tolerance: ±1%; Voltage Rating: 200V; Temperature Coefficient: ±100ppm/℃; Temperature Rating: -55℃~+155℃; ComponentLink1Description: Datasheet; ComponentLink1URL: https://wmsc.lcsc.com/wmsc/upload/file/pdf/v2/lcsc/2304140030_Ever-Ohms-Tech-CRH2512F330RE04Z_C175302.pdf; ComponentLink2Description: JLCPCB Part URL; ComponentLink2URL: https://jlcpcb.com/partdetail/C175302
pins: 1, 2
1 alternate drawing of the same symbol

## CRH2512F390KE04Z
designator R?  Resistance: 390kΩ  (hidden comment: *)
Resistor, 390kΩ, ±1%, 2W, 200V, ±100ppm/℃, -55℃~+155℃, SMD 2512; Manufacturer: Uniroyal; Manufacturer Part Number: CRH2512F390KE04Z; Supplier 1: LCSC; Supplier Part Number 1: C175386; JLCPCB Part Number: C175386; Power Rating: 2W; Category: Resistors; Package Size: 2512; JLCPCB Basic Part: Yes; Tolerance: ±1%; Voltage Rating: 200V; Temperature Coefficient: ±100ppm/℃; Temperature Rating: -55℃~+155℃; ComponentLink1Description: Datasheet; ComponentLink1URL: https://wmsc.lcsc.com/wmsc/upload/file/pdf/v2/lcsc/2304140030_Ever-Ohms-Tech-CRH2512F390KE04Z_C175386.pdf; ComponentLink2Description: JLCPCB Part URL; ComponentLink2URL: https://jlcpcb.com/partdetail/C175386
pins: 1, 2
1 alternate drawing of the same symbol

## CRH2512F470RE04Z
designator R?  Resistance: 470Ω  (hidden comment: *)
Resistor, 470Ω, ±1%, 2W, 200V, ±100ppm/℃, -55℃~+155℃, SMD 2512; Manufacturer: Uniroyal; Manufacturer Part Number: CRH2512F470RE04Z; Supplier 1: LCSC; Supplier Part Number 1: C175312; JLCPCB Part Number: C175312; Power Rating: 2W; Category: Resistors; Package Size: 2512; JLCPCB Basic Part: Yes; Tolerance: ±1%; Voltage Rating: 200V; Temperature Coefficient: ±100ppm/℃; Temperature Rating: -55℃~+155℃; ComponentLink1Description: Datasheet; ComponentLink1URL: https://wmsc.lcsc.com/wmsc/upload/file/pdf/v2/lcsc/2304140030_Ever-Ohms-Tech-CRH2512F470RE04Z_C175312.pdf; ComponentLink2Description: JLCPCB Part URL; ComponentLink2URL: https://jlcpcb.com/partdetail/C175312
pins: 1, 2
1 alternate drawing of the same symbol

## CRH2512F806KE04Z
designator R?  Resistance: 806kΩ  (hidden comment: *)
Resistor, 806kΩ, ±1%, 2W, 200V, ±100ppm/℃, -55℃~+155℃, SMD 2512; Manufacturer: Uniroyal; Manufacturer Part Number: CRH2512F806KE04Z; Supplier 1: LCSC; Supplier Part Number 1: C175394; JLCPCB Part Number: C175394; Power Rating: 2W; Category: Resistors; Package Size: 2512; JLCPCB Basic Part: Yes; Tolerance: ±1%; Voltage Rating: 200V; Temperature Coefficient: ±100ppm/℃; Temperature Rating: -55℃~+155℃; ComponentLink1Description: Datasheet; ComponentLink1URL: https://wmsc.lcsc.com/wmsc/upload/file/pdf/v2/lcsc/2304140030_Ever-Ohms-Tech-CRH2512F806KE04Z_C175394.pdf; ComponentLink2Description: JLCPCB Part URL; ComponentLink2URL: https://jlcpcb.com/partdetail/C175394
pins: 1, 2
1 alternate drawing of the same symbol

## CRH2512FR300E04Z
designator R?  Resistance: 300mΩ  (hidden comment: *)
Resistor, 300mΩ, ±1%, 2W, 200V, -55℃~+155℃, SMD 2512; Manufacturer: Uniroyal; Manufacturer Part Number: CRH2512FR300E04Z; Supplier 1: LCSC; Supplier Part Number 1: C149850; JLCPCB Part Number: C149850; Power Rating: 2W; Category: Resistors; Package Size: 2512; JLCPCB Basic Part: Yes; Tolerance: ±1%; Voltage Rating: 200V; Temperature Rating: -55℃~+155℃; ComponentLink1Description: Datasheet; ComponentLink1URL: https://wmsc.lcsc.com/wmsc/upload/file/pdf/v2/lcsc/2304140030_Ever-Ohms-Tech-CRH2512FR300E04Z_C149850.pdf; ComponentLink2Description: JLCPCB Part URL; ComponentLink2URL: https://jlcpcb.com/partdetail/C149850
pins: 1, 2
1 alternate drawing of the same symbol

## CRH2512FR620E04Z
designator R?  Resistance: 620mΩ  (hidden comment: *)
Resistor, 620mΩ, ±1%, 2W, 200V, -55℃~+155℃, SMD 2512; Manufacturer: Uniroyal; Manufacturer Part Number: CRH2512FR620E04Z; Supplier 1: LCSC; Supplier Part Number 1: C149851; JLCPCB Part Number: C149851; Power Rating: 2W; Category: Resistors; Package Size: 2512; JLCPCB Basic Part: Yes; Tolerance: ±1%; Voltage Rating: 200V; Temperature Rating: -55℃~+155℃; ComponentLink1Description: Datasheet; ComponentLink1URL: https://wmsc.lcsc.com/wmsc/upload/file/pdf/v2/lcsc/2304140030_Ever-Ohms-Tech-CRH2512FR620E04Z_C149851.pdf; ComponentLink2Description: JLCPCB Part URL; ComponentLink2URL: https://jlcpcb.com/partdetail/C149851
pins: 1, 2
1 alternate drawing of the same symbol

## CRH2512J0R00E04Z
designator R?  Resistance: 0Ω  (hidden comment: *)
Resistor, 0Ω, ±5%, 2W, 200V, -55℃~+155℃, SMD 2512; Manufacturer: Uniroyal; Manufacturer Part Number: CRH2512J0R00E04Z; Supplier 1: LCSC; Supplier Part Number 1: C175404; JLCPCB Part Number: C175404; Power Rating: 2W; Category: Resistors; Package Size: 2512; JLCPCB Basic Part: Yes; Tolerance: ±5%; Voltage Rating: 200V; Temperature Rating: -55℃~+155℃; ComponentLink1Description: Datasheet; ComponentLink1URL: https://wmsc.lcsc.com/wmsc/upload/file/pdf/v2/lcsc/2304140030_Ever-Ohms-Tech-CRH2512J0R00E04Z_C175404.pdf; ComponentLink2Description: JLCPCB Part URL; ComponentLink2URL: https://jlcpcb.com/partdetail/C175404
pins: 1, 2
1 alternate drawing of the same symbol